# Altium footprint library Connectors_2,54mm.PcbLib: 400 footprints (part 1 of 26)
Each footprint in its own frame and in the unit in brackets; x right, y up, seen from the top. Pads: shape width x height; smd on the part's side, far side on the other; paste and mask are expansions set on the pad; w line width, h text height; cw(c..) or ccw(c..) is an arc to the next point about the centre after c.
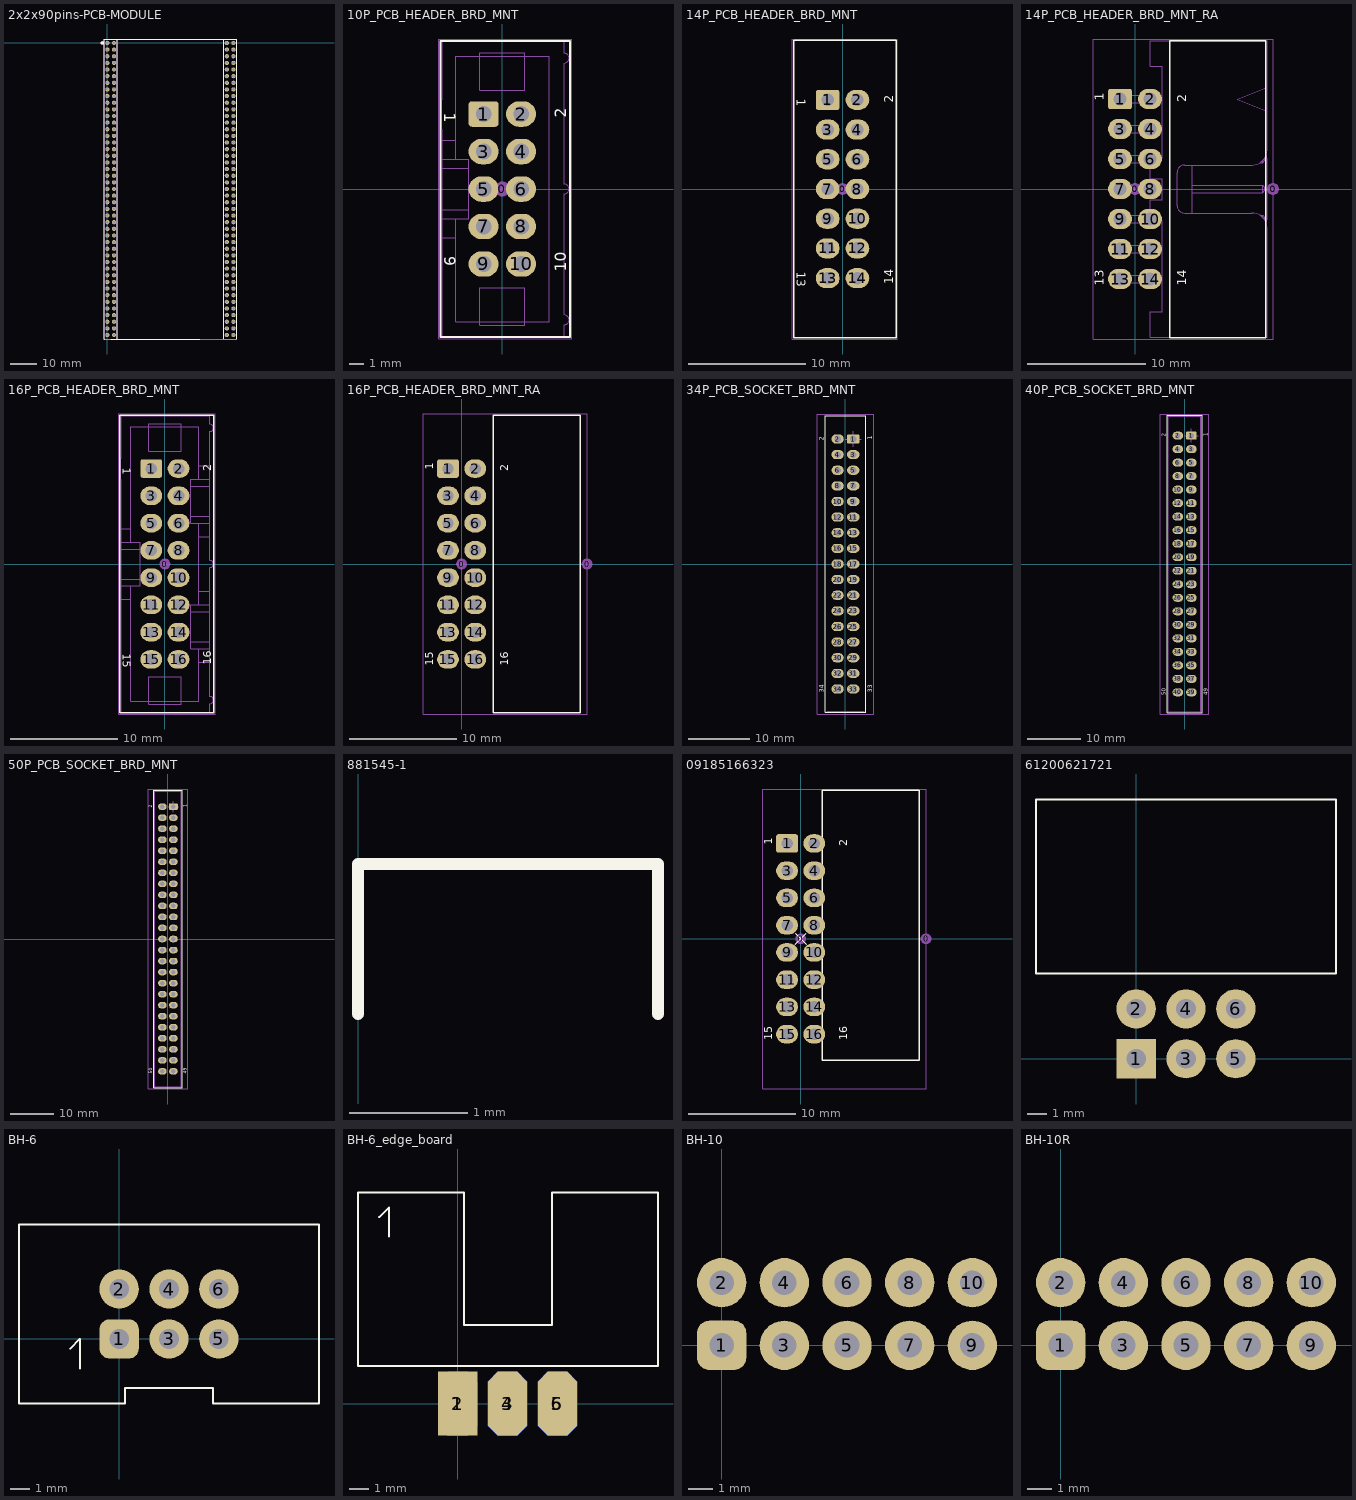
[diagram p0: the footprints below, top view; thin cyan lines are the x and y axes]

## 2x2x90pins-PCB-MODULE [mm]
pads (180):
  round 1.6 / inner round 1.6 / far side round 1.8 hole 1: 1(0,0) 2(2.54,0) 3(0,-2.54) 4(2.54,-2.54) 5(0,-5.08) 6(2.54,-5.08) 7(0,-7.62) 8(2.54,-7.62) 9(0,-10.16) 10(2.54,-10.16) 11(0,-12.7) 12(2.54,-12.7) 13(0,-15.24) 14(2.54,-15.24) 15(0,-17.78) 16(2.54,-17.78) 17(0,-20.32) 18(2.54,-20.32) 19(0,-22.86) 20(2.54,-22.86) 21(0,-25.4) 22(2.54,-25.4) 23(0,-27.94) 24(2.54,-27.94) 25(0,-30.48) 26(2.54,-30.48) 27(0,-33.02) 28(2.54,-33.02) 29(0,-35.56) 30(2.54,-35.56) 31(0,-38.1) 32(2.54,-38.1) 33(0,-40.64) 34(2.54,-40.64) 35(0,-43.18) 36(2.54,-43.18) 37(0,-45.72) 38(2.54,-45.72) 39(0,-48.26) 40(2.54,-48.26) 41(0,-50.8) 42(2.54,-50.8) 43(0,-53.34) 44(2.54,-53.34) 45(0,-55.88) 46(2.54,-55.88) 47(0,-58.42) 48(2.54,-58.42) 49(0,-60.96) 50(2.54,-60.96) 51(0,-63.5) 52(2.54,-63.5) 53(0,-66.04) 54(2.54,-66.04) 55(0,-68.58) 56(2.54,-68.58) 57(0,-71.12) 58(2.54,-71.12) 59(0,-73.66) 60(2.54,-73.66) 61(0,-76.2) 62(2.54,-76.2) 63(0,-78.74) 64(2.54,-78.74) 65(0,-81.28) 66(2.54,-81.28) 67(0,-83.82) 68(2.54,-83.82) 69(0,-86.36) 70(2.54,-86.36) 71(0,-88.9) 72(2.54,-88.9) 73(0,-91.44) 74(2.54,-91.44) 75(0,-93.98) 76(2.54,-93.98) 77(0,-96.52) 78(2.54,-96.52) 79(0,-99.06) 80(2.54,-99.06) 81(0,-101.6) 82(2.54,-101.6) 83(0,-104.14) 84(2.54,-104.14) 85(0,-106.68) 86(2.54,-106.68) 87(0,-109.22) 88(2.54,-109.22) 89(0,-111.76) 90(2.54,-111.76) 91(45.72,0) 92(48.26,0) 93(45.72,-2.54) 94(48.26,-2.54) 95(45.72,-5.08) 96(48.26,-5.08) 97(45.72,-7.62) 98(48.26,-7.62) 99(45.72,-10.16) 100(48.26,-10.16) 101(45.72,-12.7) 102(48.26,-12.7) 103(45.72,-15.24) 104(48.26,-15.24) 105(45.72,-17.78) 106(48.26,-17.78) 107(45.72,-20.32) 108(48.26,-20.32) 109(45.72,-22.86) 110(48.26,-22.86) 111(45.72,-25.4) 112(48.26,-25.4) 113(45.72,-27.94) 114(48.26,-27.94) 115(45.72,-30.48) 116(48.26,-30.48) 117(45.72,-33.02) 118(48.26,-33.02) 119(45.72,-35.56) 120(48.26,-35.56) 121(45.72,-38.1) 122(48.26,-38.1) 123(45.72,-40.64) 124(48.26,-40.64) 125(45.72,-43.18) 126(48.26,-43.18) 127(45.72,-45.72) 128(48.26,-45.72) 129(45.72,-48.26) 130(48.26,-48.26) 131(45.72,-50.8) 132(48.26,-50.8) 133(45.72,-53.34) 134(48.26,-53.34) 135(45.72,-55.88) 136(48.26,-55.88) 137(45.72,-58.42) 138(48.26,-58.42) 139(45.72,-60.96) 140(48.26,-60.96) 141(45.72,-63.5) 142(48.26,-63.5) 143(45.72,-66.04) 144(48.26,-66.04) 145(45.72,-68.58) 146(48.26,-68.58) 147(45.72,-71.12) 148(48.26,-71.12) 149(45.72,-73.66) 150(48.26,-73.66) 151(45.72,-76.2) 152(48.26,-76.2) 153(45.72,-78.74) 154(48.26,-78.74) 155(45.72,-81.28) 156(48.26,-81.28) 157(45.72,-83.82) 158(48.26,-83.82) 159(45.72,-86.36) 160(48.26,-86.36) 161(45.72,-88.9) 162(48.26,-88.9) 163(45.72,-91.44) 164(48.26,-91.44) 165(45.72,-93.98) 166(48.26,-93.98) 167(45.72,-96.52) 168(48.26,-96.52) 169(45.72,-99.06) 170(48.26,-99.06) 171(45.72,-101.6) 172(48.26,-101.6) 173(45.72,-104.14) 174(48.26,-104.14) 175(45.72,-106.68) 176(48.26,-106.68) 177(45.72,-109.22) 178(48.26,-109.22) 179(45.72,-111.76) 180(48.26,-111.76)
Top Overlay:
  lines w0.152: 1.27,-113.284 35.27,-113.284 ; 1.27,1.524 35.27,1.524 ; 32.806,-113.284 49.479,-113.284 49.479,1.524 32.806,1.524 ; 44.526,-113.284 44.526,1.524 ; -1.194,-113.284 3.759,-113.284 3.759,1.524 -1.194,1.524 -1.194,-113.284
  lines w0.508: -1.905,-0.381 ccw(c-1.905,0) -1.905,0.381 ccw(c-1.905,0) -1.905,-0.381
Mechanical 13:
  lines w0.152: -1.194,-113.284 3.759,-113.284 3.759,1.524 -1.194,1.524 -1.194,-113.284 ; 44.526,-113.284 49.479,-113.284 49.479,1.524 44.526,1.524 44.526,-113.284
  lines w0.508: -2.286,0 ccw(c-1.905,0) -1.524,0 ccw(c-1.905,0) -2.286,0
3D body "PBD-2.stp": height 8.5, standoff -3.15, extent -1.27,-34.29 1.27,-29.21
3D body "PBD-2.stp": height 8.5, standoff -3.15, extent -1.27,-29.21 1.27,-24.13
3D body "PBD-2.stp": height 8.5, standoff -3.15, extent -1.27,-24.13 1.27,-19.05
3D body "PBD-2.stp": height 8.5, standoff -3.15, extent -1.27,-19.05 1.27,-13.97
3D body "PBD-2.stp": height 8.5, standoff -3.15, extent -1.27,-13.97 1.27,-8.89
3D body "PBD-2.stp": height 8.5, standoff -3.15, extent -1.27,-8.89 1.27,-3.81
3D body "PBD-2.stp": height 8.5, standoff -3.15, extent -1.27,-3.81 1.27,1.27
3D body "PBS-1.stp": height 8.5, standoff -3.15, extent -1.27,-36.83 1.27,-34.29
3D body "PBD-2.stp": height 8.5, standoff -3.15, extent 1.27,-34.29 3.81,-29.21
3D body "PBD-2.stp": height 8.5, standoff -3.15, extent 1.27,-29.21 3.81,-24.13
3D body "PBD-2.stp": height 8.5, standoff -3.15, extent 1.27,-24.13 3.81,-19.05
3D body "PBD-2.stp": height 8.5, standoff -3.15, extent 1.27,-19.05 3.81,-13.97
3D body "PBD-2.stp": height 8.5, standoff -3.15, extent 1.27,-13.97 3.81,-8.89
3D body "PBD-2.stp": height 8.5, standoff -3.15, extent 1.27,-8.89 3.81,-3.81
3D body "PBD-2.stp": height 8.5, standoff -3.15, extent 1.27,-3.81 3.81,1.27
3D body "PBS-1.stp": height 8.5, standoff -3.15, extent 1.27,-36.83 3.81,-34.29
3D body "PBD-2.stp": height 8.5, standoff -3.15, extent -1.27,-72.39 1.27,-67.31
3D body "PBD-2.stp": height 8.5, standoff -3.15, extent -1.27,-67.31 1.27,-62.23
3D body "PBD-2.stp": height 8.5, standoff -3.15, extent -1.27,-62.23 1.27,-57.15
3D body "PBD-2.stp": height 8.5, standoff -3.15, extent -1.27,-57.15 1.27,-52.07
3D body "PBD-2.stp": height 8.5, standoff -3.15, extent -1.27,-52.07 1.27,-46.99
3D body "PBD-2.stp": height 8.5, standoff -3.15, extent -1.27,-46.99 1.27,-41.91
3D body "PBD-2.stp": height 8.5, standoff -3.15, extent -1.27,-41.91 1.27,-36.83
3D body "PBS-1.stp": height 8.5, standoff -3.15, extent -1.27,-74.93 1.27,-72.39
3D body "PBD-2.stp": height 8.5, standoff -3.15, extent 1.27,-72.39 3.81,-67.31
3D body "PBD-2.stp": height 8.5, standoff -3.15, extent 1.27,-67.31 3.81,-62.23
3D body "PBD-2.stp": height 8.5, standoff -3.15, extent 1.27,-62.23 3.81,-57.15
3D body "PBD-2.stp": height 8.5, standoff -3.15, extent 1.27,-57.15 3.81,-52.07
3D body "PBD-2.stp": height 8.5, standoff -3.15, extent 1.27,-52.07 3.81,-46.99
3D body "PBD-2.stp": height 8.5, standoff -3.15, extent 1.27,-46.99 3.81,-41.91
3D body "PBD-2.stp": height 8.5, standoff -3.15, extent 1.27,-41.91 3.81,-36.83
3D body "PBS-1.stp": height 8.5, standoff -3.15, extent 1.27,-74.93 3.81,-72.39
3D body "PBD-2.stp": height 8.5, standoff -3.15, extent -1.27,-110.49 1.27,-105.41
3D body "PBD-2.stp": height 8.5, standoff -3.15, extent -1.27,-105.41 1.27,-100.33
3D body "PBD-2.stp": height 8.5, standoff -3.15, extent -1.27,-100.33 1.27,-95.25
3D body "PBD-2.stp": height 8.5, standoff -3.15, extent -1.27,-95.25 1.27,-90.17
3D body "PBD-2.stp": height 8.5, standoff -3.15, extent -1.27,-90.17 1.27,-85.09
3D body "PBD-2.stp": height 8.5, standoff -3.15, extent -1.27,-85.09 1.27,-80.01
3D body "PBD-2.stp": height 8.5, standoff -3.15, extent -1.27,-80.01 1.27,-74.93
3D body "PBS-1.stp": height 8.5, standoff -3.15, extent -1.27,-113.03 1.27,-110.49
3D body "PBD-2.stp": height 8.5, standoff -3.15, extent 1.27,-110.49 3.81,-105.41
3D body "PBD-2.stp": height 8.5, standoff -3.15, extent 1.27,-105.41 3.81,-100.33
3D body "PBD-2.stp": height 8.5, standoff -3.15, extent 1.27,-100.33 3.81,-95.25
3D body "PBD-2.stp": height 8.5, standoff -3.15, extent 1.27,-95.25 3.81,-90.17
3D body "PBD-2.stp": height 8.5, standoff -3.15, extent 1.27,-90.17 3.81,-85.09
3D body "PBD-2.stp": height 8.5, standoff -3.15, extent 1.27,-85.09 3.81,-80.01
3D body "PBD-2.stp": height 8.5, standoff -3.15, extent 1.27,-80.01 3.81,-74.93
3D body "PBS-1.stp": height 8.5, standoff -3.15, extent 1.27,-113.03 3.81,-110.49
3D body "PBD-2.stp": height 8.5, standoff -3.15, extent 44.45,-34.29 46.99,-29.21
3D body "PBD-2.stp": height 8.5, standoff -3.15, extent 44.45,-29.21 46.99,-24.13
3D body "PBD-2.stp": height 8.5, standoff -3.15, extent 44.45,-24.13 46.99,-19.05
3D body "PBD-2.stp": height 8.5, standoff -3.15, extent 44.45,-19.05 46.99,-13.97
3D body "PBD-2.stp": height 8.5, standoff -3.15, extent 44.45,-13.97 46.99,-8.89
3D body "PBD-2.stp": height 8.5, standoff -3.15, extent 44.45,-8.89 46.99,-3.81
3D body "PBD-2.stp": height 8.5, standoff -3.15, extent 44.45,-3.81 46.99,1.27
3D body "PBS-1.stp": height 8.5, standoff -3.15, extent 44.45,-36.83 46.99,-34.29
3D body "PBD-2.stp": height 8.5, standoff -3.15, extent 46.99,-34.29 49.53,-29.21
3D body "PBD-2.stp": height 8.5, standoff -3.15, extent 46.99,-29.21 49.53,-24.13
3D body "PBD-2.stp": height 8.5, standoff -3.15, extent 46.99,-24.13 49.53,-19.05
3D body "PBD-2.stp": height 8.5, standoff -3.15, extent 46.99,-19.05 49.53,-13.97
3D body "PBD-2.stp": height 8.5, standoff -3.15, extent 46.99,-13.97 49.53,-8.89
3D body "PBD-2.stp": height 8.5, standoff -3.15, extent 46.99,-8.89 49.53,-3.81
3D body "PBD-2.stp": height 8.5, standoff -3.15, extent 46.99,-3.81 49.53,1.27
3D body "PBS-1.stp": height 8.5, standoff -3.15, extent 46.99,-36.83 49.53,-34.29
3D body "PBD-2.stp": height 8.5, standoff -3.15, extent 44.45,-72.39 46.99,-67.31
3D body "PBD-2.stp": height 8.5, standoff -3.15, extent 44.45,-67.31 46.99,-62.23
3D body "PBD-2.stp": height 8.5, standoff -3.15, extent 44.45,-62.23 46.99,-57.15
3D body "PBD-2.stp": height 8.5, standoff -3.15, extent 44.45,-57.15 46.99,-52.07
3D body "PBD-2.stp": height 8.5, standoff -3.15, extent 44.45,-52.07 46.99,-46.99
3D body "PBD-2.stp": height 8.5, standoff -3.15, extent 44.45,-46.99 46.99,-41.91
3D body "PBD-2.stp": height 8.5, standoff -3.15, extent 44.45,-41.91 46.99,-36.83
3D body "PBS-1.stp": height 8.5, standoff -3.15, extent 44.45,-74.93 46.99,-72.39
3D body "PBD-2.stp": height 8.5, standoff -3.15, extent 46.99,-72.39 49.53,-67.31
3D body "PBD-2.stp": height 8.5, standoff -3.15, extent 46.99,-67.31 49.53,-62.23
3D body "PBD-2.stp": height 8.5, standoff -3.15, extent 46.99,-62.23 49.53,-57.15
3D body "PBD-2.stp": height 8.5, standoff -3.15, extent 46.99,-57.15 49.53,-52.07
3D body "PBD-2.stp": height 8.5, standoff -3.15, extent 46.99,-52.07 49.53,-46.99
3D body "PBD-2.stp": height 8.5, standoff -3.15, extent 46.99,-46.99 49.53,-41.91
3D body "PBD-2.stp": height 8.5, standoff -3.15, extent 46.99,-41.91 49.53,-36.83
3D body "PBS-1.stp": height 8.5, standoff -3.15, extent 46.99,-74.93 49.53,-72.39
3D body "PBD-2.stp": height 8.5, standoff -3.15, extent 44.45,-110.49 46.99,-105.41
3D body "PBD-2.stp": height 8.5, standoff -3.15, extent 44.45,-105.41 46.99,-100.33
3D body "PBD-2.stp": height 8.5, standoff -3.15, extent 44.45,-100.33 46.99,-95.25
3D body "PBD-2.stp": height 8.5, standoff -3.15, extent 44.45,-95.25 46.99,-90.17
3D body "PBD-2.stp": height 8.5, standoff -3.15, extent 44.45,-90.17 46.99,-85.09
3D body "PBD-2.stp": height 8.5, standoff -3.15, extent 44.45,-85.09 46.99,-80.01
3D body "PBD-2.stp": height 8.5, standoff -3.15, extent 44.45,-80.01 46.99,-74.93
3D body "PBS-1.stp": height 8.5, standoff -3.15, extent 44.45,-113.03 46.99,-110.49
3D body "PBD-2.stp": height 8.5, standoff -3.15, extent 46.99,-110.49 49.53,-105.41
3D body "PBD-2.stp": height 8.5, standoff -3.15, extent 46.99,-105.41 49.53,-100.33
3D body "PBD-2.stp": height 8.5, standoff -3.15, extent 46.99,-100.33 49.53,-95.25
3D body "PBD-2.stp": height 8.5, standoff -3.15, extent 46.99,-95.25 49.53,-90.17
3D body "PBD-2.stp": height 8.5, standoff -3.15, extent 46.99,-90.17 49.53,-85.09
3D body "PBD-2.stp": height 8.5, standoff -3.15, extent 46.99,-85.09 49.53,-80.01
3D body "PBD-2.stp": height 8.5, standoff -3.15, extent 46.99,-80.01 49.53,-74.93
3D body "PBS-1.stp": height 8.5, standoff -3.15, extent 46.99,-113.03 49.53,-110.49

## 10P_PCB_HEADER_BRD_MNT [mil] "HEADER BRD MNT 10POS 2.54MM"
height 390
pads (11):
  round 40 on Mech15: 0(0,0)
  rrect25% 80x68 hole 42: 1(-50,200)
  oval 80x68 hole 42: 2(50,200) 3(-50,100) 4(50,100) 5(-50,0) 6(50,0) 7(-50,-100) 8(50,-100) 9(-50,-200) 10(50,-200)
Top Overlay:
  lines w5: -165,-395 -165,395 180,395 180,-395 -165,-395
  text "2" at 170,190 h30
  text "1" at -155,203.57 h30
  text "10" at 170,-220.28 h30
  text "9" at -155,-179 h30
Mechanical 13:
  drawing of 154 lines, arcs and shapes, not listed
Mechanical 15:
  lines w3: -170,-400 -170,400 185,400 185,-400 -170,-400
3D body "D2510-6002-AR (10P).STEP": height 390, standoff -120, extent -161.99,-393.99 178.01,394.01

## 14P_PCB_HEADER_BRD_MNT [mil] "HEADER BRD MNT 14POS 2.54MM"
height 390
pads (15):
  round 40 on Mech15: 0(0,0)
  rrect25% 80x68 hole 42: 1(-50,300)
  oval 80x68 hole 42: 2(50,300) 3(-50,200) 4(50,200) 5(-50,100) 6(50,100) 7(-50,0) 8(50,0) 9(-50,-100) 10(50,-100) 11(-50,-200) 12(50,-200) 13(-50,-300) 14(50,-300)
Top Overlay:
  lines w5: -165,-500 180,-500 180,500 -165,500 -165,-500
  text "13" at -155,-279 h30
  text "14" at 170,-320.28 h30
  text "1" at -155,303.57 h30
  text "2" at 170,290 h30
Mechanical 15:
  lines w3: -170,-505 185,-505 185,505 -170,505 -170,-505
3D body "D2514-6002-AR (14P).STEP": height 390, standoff -120, extent -161.99,-493.99 178.01,494.01

## 14P_PCB_HEADER_BRD_MNT_RA [mil] "HEADER BRD MNT R/A 14POS 2.54MM"
height 338
pads (16):
  round 40 on Mech15: 0(0,0) 0(460,0)
  rrect25% 80x68 hole 42: 1(-50,300)
  oval 80x68 hole 42: 2(50,300) 3(-50,200) 4(50,200) 5(-50,100) 6(50,100) 7(-50,0) 8(50,0) 9(-50,-100) 10(50,-100) 11(-50,-200) 12(50,-200) 13(-50,-300) 14(50,-300)
Top Overlay:
  lines w5: 115,-495 115,495 435,495 435,-495 115,-495
  text "2" at 170,290 h30
  text "1" at -105,295 h30
  text "14" at 170,-323 h30
  text "13" at -105,-323 h30
Mechanical 13:
  lines w1.97: -17.5,-312.25 -17.5,-287.75 ; -17.5,-212.25 -17.5,-187.75 ; -17.5,-112.25 -17.5,-87.75 ; -17.5,-12.25 -17.5,12.25 ; -17.5,87.75 -17.5,112.25 ; -17.5,187.75 -17.5,212.25 ; -17.5,287.75 -17.5,312.25 ; 50,-87.75 -62.5,-87.75 -62.5,-112.25 90,-112.25 ; 50,87.75 -62.5,87.75 -62.5,112.25 90,112.25 ; 90,-312.25 -62.5,-312.25 -62.5,-287.75 90,-287.75 ; 90,-212.25 -62.5,-212.25 -62.5,-187.75 90,-187.75 ; 90,-12.25 -62.5,-12.25 -62.5,12.25 90,12.25 ; 90,187.75 -62.5,187.75 -62.5,212.25 90,212.25 ; 90,287.75 -62.5,287.75 -62.5,312.25 90,312.25 ; 190,-80 190,80 ; 190,-12.25 425,-12.25 ; 190,12.25 425,12.25 ; 416.74,-87.75 425,-87.75 ; 416.74,87.75 425,87.75 ; 425,-94.29 425,-87.75 ; 425,94.29 425,87.75 ; 433,-104.25 433,-95.75 425,-87.75 ; 433,104.25 433,95.75 425,87.75 ; 437.7,-115 ccw(c390,-100) 440,-100 440,100 ccw(c390,100) 437.7,115 ; 440,260 340,300 440,340 ; 425,-12.25 425,12.25 ; 425,-12.25 433,-4.25 433,4.25 425,12.25 ; 50,-494 440,-494 440,-130 ccw(c390,-130) 390,-80 165,-80 cw(c165,-55) 140,-55 140,55 cw(c165,55) 165,80 390,80 ccw(c390,130) 440,130 440,494 50,494 50,409 90,409 90,105 50,105 50,35 90,35 90,-35 50,-35 50,-105 90,-105 90,-409 50,-409 50,-494
Mechanical 15:
  lines w3: -140,-500 -140,500 460,500 460,-500 -140,-500
3D body "D2514-5002-AR (14P_RA).STEP": height 340, standoff -112, extent -62.49,-493.99 440.01,494.01

## 16P_PCB_HEADER_BRD_MNT [mil] "HEADER BRD MNT 16POS 2.54MM"
height 390
pads (17):
  round 40 on Mech15: 0(0,0)
  rrect25% 80x68 hole 42: 1(-50,350)
  oval 80x68 hole 42: 2(50,350) 3(-50,250) 4(50,250) 5(-50,150) 6(50,150) 7(-50,50) 8(50,50) 9(-50,-50) 10(50,-50) 11(-50,-150) 12(50,-150) 13(-50,-250) 14(50,-250) 15(-50,-350) 16(50,-350)
Top Overlay:
  lines w5: -165,-545 -165,545 180,545 180,-545 -165,-545
  text "2" at 170,340 h30
  text "1" at -155,353.57 h30
  text "16" at 170,-370.28 h30
  text "15" at -155,-329 h30
Mechanical 13:
  drawing of 242 lines, arcs and shapes, not listed
Mechanical 15:
  lines w3: -170,-550 -170,550 185,550 185,-550 -170,-550
3D body "D2516-6002-AR (16P).STEP": height 390, standoff -120, extent -161.99,-543.99 178.01,544.01

## 16P_PCB_HEADER_BRD_MNT_RA [mil] "HEADER BRD MNT R/A 16POS 2.54MM"
height 338
pads (18):
  round 40 on Mech15: 0(0,0) 0(460,0)
  rrect25% 80x68 hole 42: 1(-50,350)
  oval 80x68 hole 42: 2(50,350) 3(-50,250) 4(50,250) 5(-50,150) 6(50,150) 7(-50,50) 8(50,50) 9(-50,-50) 10(50,-50) 11(-50,-150) 12(50,-150) 13(-50,-250) 14(50,-250) 15(-50,-350) 16(50,-350)
Top Overlay:
  lines w5: 115,-545 115,545 435,545 435,-545 115,-545
  text "2" at 170,340 h30
  text "1" at -105,345 h30
  text "16" at 170,-373 h30
  text "15" at -105,-373 h30
Mechanical 15:
  lines w3: -140,-550 -140,550 460,550 460,-550 -140,-550
3D body "Box Header 3M 2516_RA.STEP": height 340, standoff -112, extent -62.24,-543.99 440.01,544.01

## 34P_PCB_SOCKET_BRD_MNT [mm] "SOCKET BRD MNT 34POS 2.54MM"
height 10.8
pads (34):
  rrect25% 2x1.5 hole 1.067: 1(1.27,20.32)
  oval 2x1.5 hole 1.067: 2(-1.27,20.32) 3(1.27,17.78) 4(-1.27,17.78) 5(1.27,15.24) 6(-1.27,15.24) 7(1.27,12.7) 8(-1.27,12.7) 9(1.27,10.16) 10(-1.27,10.16) 11(1.27,7.62) 12(-1.27,7.62) 13(1.27,5.08) 14(-1.27,5.08) 15(1.27,2.54) 16(-1.27,2.54) 17(1.27,0) 18(-1.27,0) 19(1.27,-2.54) 20(-1.27,-2.54) 21(1.27,-5.08) 22(-1.27,-5.08) 23(1.27,-7.62) 24(-1.27,-7.62) 25(1.27,-10.16) 26(-1.27,-10.16) 27(1.27,-12.7) 28(-1.27,-12.7) 29(1.27,-15.24) 30(-1.27,-15.24) 31(1.27,-17.78) 32(-1.27,-17.78) 33(1.27,-20.32) 34(-1.27,-20.32)
Top Overlay:
  lines w0.127: -3.302,-24.13 -3.302,24.13 3.302,24.13 3.302,-24.13 -3.302,-24.13
  text "1" at 4.318,20.193 h0.76
  text "2" at -3.556,20.066 h0.76
  text "33" at 4.318,-20.904 h0.76
  text "34" at -3.556,-20.904 h0.76
Mechanical 13:
  lines w0.076: -3.05,-23.92 3.05,-23.92
Mechanical 15:
  lines w0.076: 0,20.32 2.54,20.32 ; 1.27,19.05 1.27,21.59 ; -4.572,-24.384 -4.572,24.384 4.572,24.384 4.572,-24.384 -4.572,-24.384
3D body "34P BoxHeader.stp": height 10.8, standoff -2.8, extent -3.05,-23.925 4.05,23.915

## 40P_PCB_SOCKET_BRD_MNT [mm] "SOCKET BRD MNT 40POS 2.54MM"
height 10.8
pads (40):
  rrect25% 2x1.5 hole 1.067: 1(1.27,24.13)
  oval 2x1.5 hole 1.067: 2(-1.27,24.13) 3(1.27,21.59) 4(-1.27,21.59) 5(1.27,19.05) 6(-1.27,19.05) 7(1.27,16.51) 8(-1.27,16.51) 9(1.27,13.97) 10(-1.27,13.97) 11(1.27,11.43) 12(-1.27,11.43) 13(1.27,8.89) 14(-1.27,8.89) 15(1.27,6.35) 16(-1.27,6.35) 17(1.27,3.81) 18(-1.27,3.81) 19(1.27,1.27) 20(-1.27,1.27) 21(1.27,-1.27) 22(-1.27,-1.27) 23(1.27,-3.81) 24(-1.27,-3.81) 25(1.27,-6.35) 26(-1.27,-6.35) 27(1.27,-8.89) 28(-1.27,-8.89) 29(1.27,-11.43) 30(-1.27,-11.43) 31(1.27,-13.97) 32(-1.27,-13.97) 33(1.27,-16.51) 34(-1.27,-16.51) 35(1.27,-19.05) 36(-1.27,-19.05) 37(1.27,-21.59) 38(-1.27,-21.59) 39(1.27,-24.13) 40(-1.27,-24.13)
Top Overlay:
  lines w0.127: -3.302,-27.94 3.302,-27.94 3.302,27.94 -3.302,27.94 -3.302,-27.94
  text "1" at 4.318,24.003 h0.76
  text "2" at -3.556,23.876 h0.76
  text "49" at 4.318,-24.714 h0.76
  text "50" at -3.556,-24.714 h0.76
Mechanical 13:
  lines w0.076: -3.05,-27.73 -3.05,27.73 3.05,27.73 3.05,-27.73 -3.05,-27.73
Mechanical 15:
  lines w0.076: 0,24.13 2.54,24.13 ; 1.27,22.86 1.27,25.4 ; -4.572,-28.194 4.572,-28.194 4.572,28.194 -4.572,28.194 -4.572,-28.194
3D body "40P BoxHeader.STEP": height 10.8, standoff -2.54, extent -3.05,-27.73 4.05,27.73

## 50P_PCB_SOCKET_BRD_MNT [mm] "SOCKET BRD MNT 50POS 2.54MM"
height 10.8
pads (50):
  rrect25% 2x1.5 hole 1.067: 1(1.27,30.48)
  oval 2x1.5 hole 1.067: 2(-1.27,30.48) 3(1.27,27.94) 4(-1.27,27.94) 5(1.27,25.4) 6(-1.27,25.4) 7(1.27,22.86) 8(-1.27,22.86) 9(1.27,20.32) 10(-1.27,20.32) 11(1.27,17.78) 12(-1.27,17.78) 13(1.27,15.24) 14(-1.27,15.24) 15(1.27,12.7) 16(-1.27,12.7) 17(1.27,10.16) 18(-1.27,10.16) 19(1.27,7.62) 20(-1.27,7.62) 21(1.27,5.08) 22(-1.27,5.08) 23(1.27,2.54) 24(-1.27,2.54) 25(1.27,0) 26(-1.27,0) 27(1.27,-2.54) 28(-1.27,-2.54) 29(1.27,-5.08) 30(-1.27,-5.08) 31(1.27,-7.62) 32(-1.27,-7.62) 33(1.27,-10.16) 34(-1.27,-10.16) 35(1.27,-12.7) 36(-1.27,-12.7) 37(1.27,-15.24) 38(-1.27,-15.24) 39(1.27,-17.78) 40(-1.27,-17.78) 41(1.27,-20.32) 42(-1.27,-20.32) 43(1.27,-22.86) 44(-1.27,-22.86) 45(1.27,-25.4) 46(-1.27,-25.4) 47(1.27,-27.94) 48(-1.27,-27.94) 49(1.27,-30.48) 50(-1.27,-30.48)
Top Overlay:
  lines w0.127: -3.302,-34.29 -3.302,34.29 3.302,34.29 3.302,-34.29 -3.302,-34.29
  text "50" at -3.556,-31.064 h0.76
  text "49" at 4.318,-31.064 h0.76
  text "2" at -3.556,30.226 h0.76
  text "1" at 4.318,30.353 h0.76
Mechanical 13:
  lines w0.076: -3.05,-34.08 3.05,-34.08 3.05,34.08 -3.05,34.08 -3.05,-34.08
Mechanical 15:
  lines w0.076: 0,30.48 2.54,30.48 ; 1.27,29.21 1.27,31.75 ; -4.572,-34.544 -4.572,34.544 4.572,34.544 4.572,-34.544 -4.572,-34.544
3D body "50P BoxHeader.stp": height 10.8, standoff -2.8, extent -3.05,-34.085 4.05,34.075

## 881545-1 [mm]
Top Overlay:
  lines w0.1: 0,1.27 0,2.54 2.54,2.54 2.54,1.27
3D body "881545-1--3DModel-STEP-1.STEP": height 13.89, standoff 3, extent -1.245,-1.245 3.785,1.245

## 09185166323 [mil] "HEADER BRD MNT R/A 16OS 2.54MM"
pads (18):
  round 40 on Mech15: 0(0,0) 0(460,0)
  rrect25% 80x68 hole 42: 1(-50,350)
  oval 80x68 hole 42: 2(50,350) 3(-50,250) 4(50,250) 5(-50,150) 6(50,150) 7(-50,50) 8(50,50) 9(-50,-50) 10(50,-50) 11(-50,-150) 12(50,-150) 13(-50,-250) 14(50,-250) 15(-50,-350) 16(50,-350)
Top Overlay:
  lines w3.94: -19.68,-19.68 19.68,19.68 ; -19.68,19.68 19.68,-19.68
  lines w5: 78.74,-445 435,-445 435,545 78.74,545 78.74,-445
  text "1" at -105,345 h30
  text "2" at 170,340 h30
  text "15" at -105,-373 h30
  text "16" at 170,-373 h30
Mechanical 15:
  lines w3: -140,-551.18 460,-551.18 460,550 -140,550 -140,-551.18
3D body "091X516X323_100081323MOD000B.STP": height 372.05, standoff -104.33, extent -63.78,-549.21 429.14,549.22

## 61200621721 [mm]
pads (6):
  rect 2x2 hole 1: 1(0,0)
  round 2 hole 1: 2(0,2.54) 3(2.54,0) 4(2.54,2.54) 5(5.08,0) 6(5.08,2.54)
Top Overlay:
  lines w0.1: -5.1,4.35 -5.1,13.2 10.18,13.2 10.18,4.35 -5.1,4.35
3D body "61200621721_Download_STP_61200621721_rev1.stp": height 9.43, standoff -2.4, extent -5.09,-0.325 10.19,13.225

## BH-6 [mm]
height 10
pads (6):
  rrect50% 2x2 hole 1: 1(0,0)
  round 2 hole 1: 2(0,2.54) 3(2.54,0) 4(2.54,2.54) 5(5.08,0) 6(5.08,2.54)
Top Overlay:
  lines w0.1: -2.5,-0.5 -2,0 -2,-1.5 ; -5.1,-3.28 0.29,-3.28 0.29,-2.5 4.79,-2.5 4.79,-3.28 10.18,-3.28 10.18,5.82 -5.1,5.82 -5.1,-3.28

## BH-6_edge_board [mm]
height 10
pads (6):
  rect 2x3.25 smd: 1(0,0)
  oct 2x3.25 smd far side: 2(0,0) 4(2.54,0) 6(5.08,0)
  oct 2x3.25 smd: 3(2.54,0) 5(5.08,0)
Top Overlay:
  lines w0.1: -3.5,8.5 -3.5,10 -4,9.5 ; -4,9.5 -4,9.5 ; -5.08,1.905 -5.08,10.755 0.31,10.755 0.31,4 4.81,4 4.81,10.755 10.2,10.755 10.2,1.905 -5.08,1.905

## BH-10 [mm]
height 10
pads (10):
  rrect50% 2x2 hole 1: 1(0,0)
  round 2 hole 1: 2(0,2.54) 3(2.54,0) 4(2.54,2.54) 5(5.08,0) 6(5.08,2.54) 7(7.62,0) 8(7.62,2.54) 9(10.16,0) 10(10.16,2.54)
3D body "User Library-BH-10__64.step": height 9.1, standoff -3, extent -5.17,-3.28 15.33,6.02

## BH-10R [mm]
height 10
pads (10):
  rrect50% 2x2 hole 1: 1(0,0)
  round 2 hole 1: 2(0,2.54) 3(2.54,0) 4(2.54,2.54) 5(5.08,0) 6(5.08,2.54) 7(7.62,0) 8(7.62,2.54) 9(10.16,0) 10(10.16,2.54)
3D body "User Library-BHR-10___64-1.step": height 9.75, standoff -2.45, extent -5.1,-0.254 15.26,13.288